# Altium footprint library SWARMUS_LIB.PcbLib: 114 footprints (part 6 of 8)
Each footprint in its own frame and in the unit in brackets; x right, y up, seen from the top. Pads: shape width x height; smd on the part's side, far side on the other; paste and mask are expansions set on the pad; w line width, h text height; cw(c..) or ccw(c..) is an arc to the next point about the centre after c.
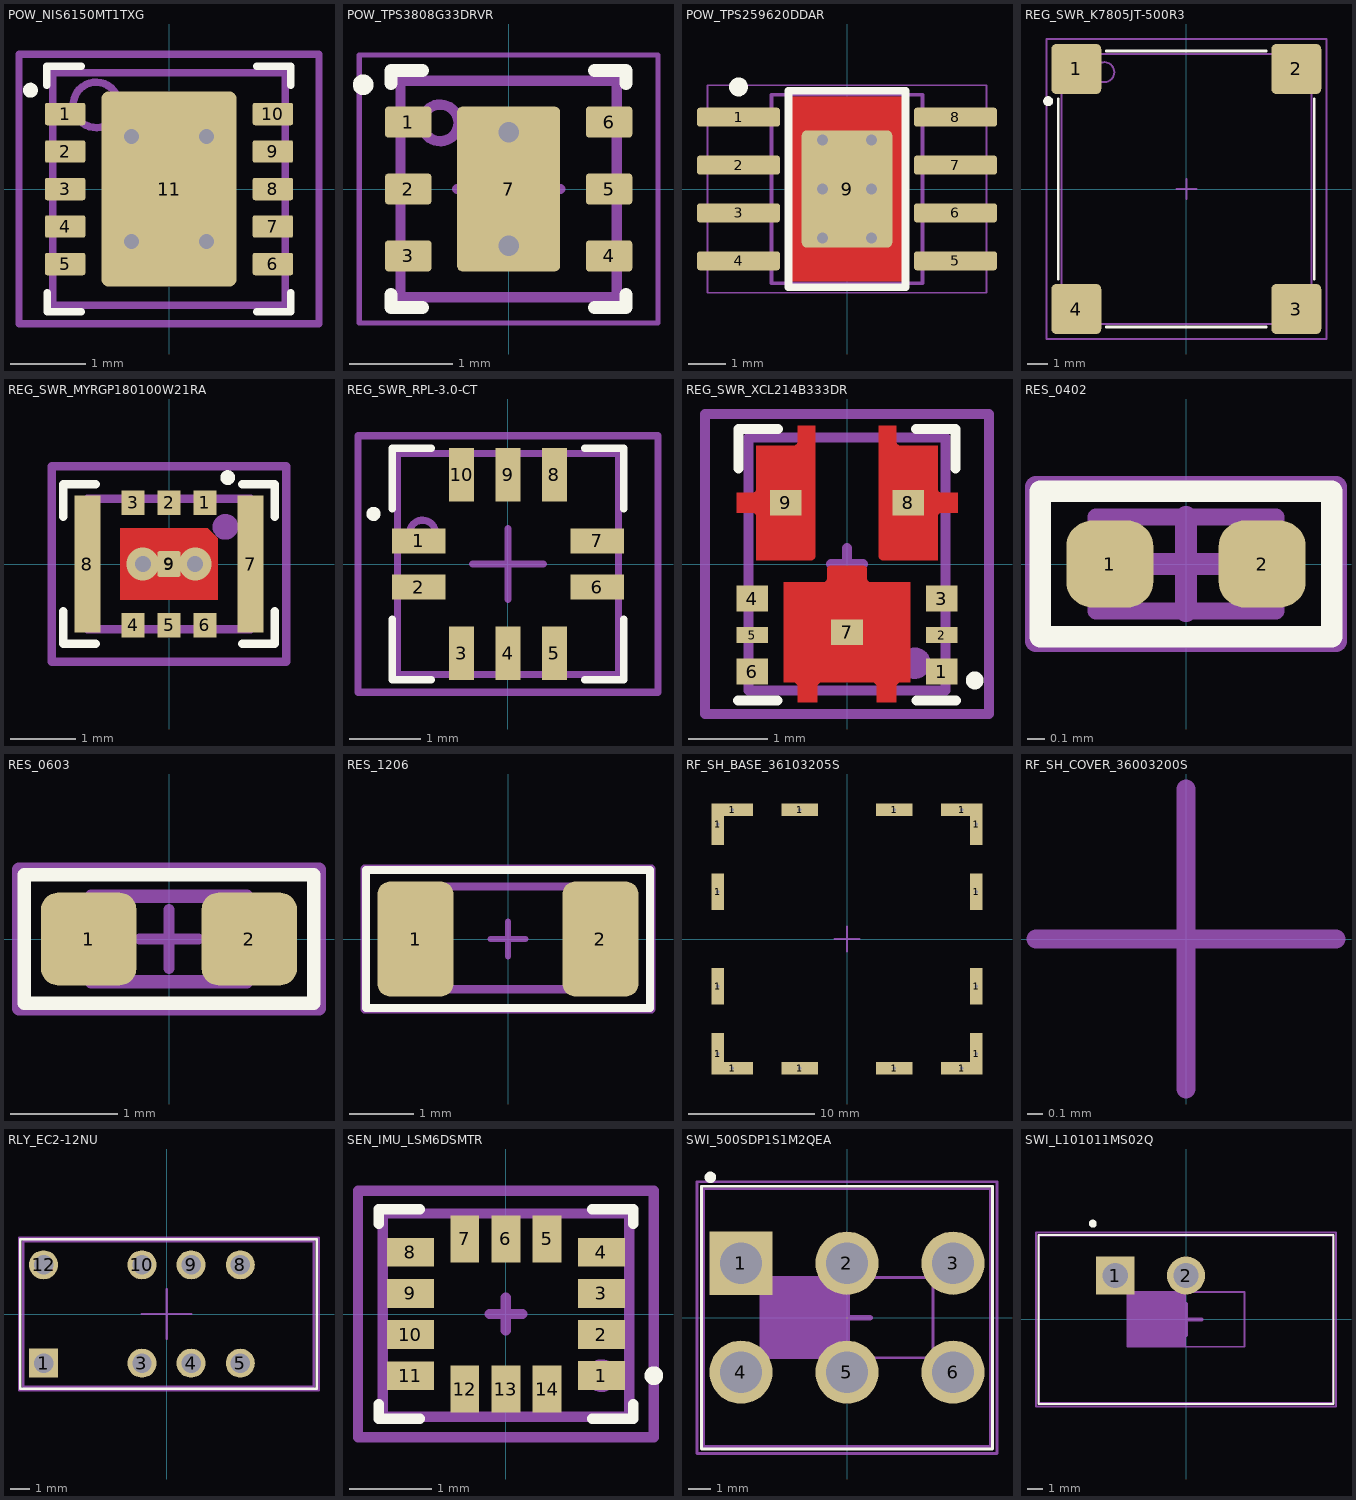
[diagram p5: the footprints below, top view; thin cyan lines are the x and y axes]

## POW_NIS6150MT1TXG [mm] "SON, 10-Leads, Body 3.00x3.00mm, Pitch 0.50mm, Thermal Pad 2.00x1.20mm, IPC Medium Density"
height 0.8
pads (11):
  rrect20% 0.54x0.3 smd paste-0.025 mask+0.048: 1(-1.385,1) 2(-1.385,0.5) 3(-1.385,0) 4(-1.385,-0.5) 5(-1.385,-1) 6(1.385,-1) 7(1.385,-0.5) 8(1.385,0) 9(1.385,0.5) 10(1.385,1)
  rrect10% 1.8x2.6 smd paste-2 mask+0.05: 11(0,0)
via 0.5,-0.7 diameter 0.5 hole 0.2
via 0.5,0.7 diameter 0.5 hole 0.2
via -0.5,-0.7 diameter 0.5 hole 0.2
via -0.5,0.7 diameter 0.5 hole 0.2
Top Overlay:
  circle w0.1: c-1.847,1.317 r0.05
  lines w0.1: -1.627,-1.381 -1.627,-1.64 -1.172,-1.64 ; -1.627,1.381 -1.627,1.639 -1.172,1.639 ; 1.172,1.639 1.627,1.639 1.627,1.381 ; 1.172,-1.64 1.627,-1.64 1.627,-1.381
Top Paste:
  rectangle: -0.8,0.15 0.8,1.25
  region: 0.8,-0.15 -0.8,-0.15 -0.8,-1.25 0.8,-1.25
Top Assembly Drawing:
  circle w0.1: c-0.973,1.122 r0.303
  lines w0.1: -1.55,-1.55 -1.55,1.55 1.55,1.55 1.55,-1.55 -1.55,-1.55
Top Courtyard:
  lines w0.1: -0.5,0 0.5,0 ; 0,-0.5 0,0.5 ; -2,-1.8 -2,1.8 2,1.8 2,-1.8 -2,-1.8
3D body "SON50P300X80_HS-11N.step": height 0.8, standoff 0, extent -1.551,-1.55 1.551,1.55

## POW_TPS3808G33DRVR [mm] "6-WSON"
height 0.8
pads (7):
  rrect20% 0.45x0.3 smd paste+0 mask+0.07: 1(-0.975,0.65) 2(-0.975,0) 3(-0.975,-0.65) 4(0.975,-0.65) 5(0.975,0) 6(0.975,0.65)
  rrect10% 1x1.6 smd paste-1.6 mask+0.07: 7(0,0)
via 0,-0.55 diameter 0.5 hole 0.2
via 0,0.55 diameter 0.5 hole 0.2
Top Overlay:
  circle w0.1: c-1.413,1.012 r0.05
  lines w0.127: -1.141,-1.025 -1.141,-1.15 -0.836,-1.15 ; -1.141,1.025 -1.141,1.15 -0.836,1.15 ; 0.836,-1.15 1.141,-1.15 1.141,-1.025 ; 0.836,1.15 1.141,1.15 1.141,1.025
Top Paste:
  region: 0.5,0.1 0.5,0.749 0.5,0.759 0.492,0.778 0.478,0.792 0.459,0.8 0.449,0.8 -0.449,0.8 -0.459,0.8 -0.478,0.793 -0.492,0.778 -0.499,0.76 -0.499,0.75 -0.499,0.1
  region: -0.5,-0.1 -0.5,-0.749 -0.5,-0.759 -0.492,-0.778 -0.478,-0.792 -0.459,-0.8 -0.449,-0.8 0.449,-0.8 0.459,-0.8 0.478,-0.793 0.492,-0.778 0.499,-0.76 0.499,-0.75 0.499,-0.1
Top Assembly Drawing:
  circle w0.1: c-0.665,0.642 r0.178
  lines w0.1: -1.05,-1.05 1.05,-1.05 1.05,1.05 -1.05,1.05 -1.05,-1.05
Top Courtyard:
  lines w0.05: -1.45,-1.3 1.45,-1.3 1.45,1.3 -1.45,1.3 -1.45,-1.3
  lines w0.1: -0.5,0 0.5,0 ; 0,-0.5 0,0.5
3D body "SON65P200X80_HS-7N.step": height 0.8, standoff 0, extent -1.051,-1.05 1.051,1.05

## POW_TPS259620DDAR [mm] "SOIC, 8-Leads, Body 4.90x3.90mm, Pitch 1.27mm, Thermal Pad 3.10x2.40mm, IPC Medium Density"
height 1.7
pads (9):
  rrect30% 2.2x0.5 smd paste-0.025 mask+0.07: 1(-2.875,1.905) 2(-2.875,0.635) 3(-2.875,-0.635) 4(-2.875,-1.905) 5(2.875,-1.905) 6(2.875,-0.635) 7(2.875,0.635) 8(2.875,1.905)
  rrect10% 2.4x3.1 smd: 9(0,0)
via 0.65,-1.3 diameter 0.5 hole 0.3
via -0.65,-1.3 diameter 0.5 hole 0.3
via 0.65,0 diameter 0.5 hole 0.3
via -0.65,0 diameter 0.5 hole 0.3
via 0.65,1.3 diameter 0.5 hole 0.3
via -0.65,1.3 diameter 0.5 hole 0.3
Top Layer:
  rectangle: -1.475,-2.45 1.475,2.45
Top Overlay:
  circle w0.25: c-2.875,2.705 r0.125
  lines w0.2: -1.55,-2.607 -1.55,2.608 1.55,2.608 1.55,-2.607 -1.55,-2.607
Top Assembly Drawing:
  circle w0.1: c-1.1,1.6 r0.5
  lines w0.1: -2,-2.5 -2,2.5 2,2.5 2,-2.5 -2,-2.5
Top Courtyard:
  lines w0.05: -3.7,-2.75 3.7,-2.75 3.7,2.75 -3.7,2.75 -3.7,-2.75
  lines w0.1: -0.5,0 0.5,0 ; 0,-0.5 0,0.5
3D body "SOIC127P600X170_HS-9N.step": height 1.7, standoff 0, extent -3,-2.5 3,2.5

## REG_SWR_K7805JT-500R3 [mm]
pads (4):
  rrect20% 2.5x2.5 smd paste-0.025 mask+0.07: 1(-5.5,6) 2(5.5,6) 3(5.5,-6) 4(-5.5,-6)
Top Overlay:
  circle w0.25: c-6.904,4.39 r0.125
  lines w0.127: -6.4,-4.5 -6.4,4.5 ; -4,-6.9 4,-6.9 ; -4,6.9 4,6.9 ; 6.4,-4.5 6.4,4.5
Top Assembly Drawing:
  circle w0.1: c-4.099,5.839 r0.5
  lines w0.1: -6.25,-5.75 -6.25,-6.75 ; -6.25,5.75 -6.25,6.75 ; -5.25,-6.75 -6.25,-6.75 ; -5.25,6.75 -6.25,6.75 ; 5.25,-6.75 6.25,-6.75 ; 5.25,6.75 6.25,6.75 ; 6.25,-5.75 6.25,-6.75 ; 6.25,5.75 6.25,6.75 ; -6.25,-6.75 -6.25,6.75 ; -6.25,-6.75 6.25,-6.75 ; -6.25,6.75 6.25,6.75 ; 6.25,-6.75 6.25,6.75
Top Courtyard:
  lines w0.1: -0.5,0 0.5,0 ; 0,-0.5 0,0.5 ; -7,-7.5 7,-7.5 7,7.5 -7,7.5 -7,-7.5
3D body: height 3.3, standoff -3.3, extent -5.5,6 -5.5,6
3D body: height 3.3, standoff -3.3, extent 5.5,6 5.5,6
3D body: height 3.3, standoff -3.3, extent 5.5,-6 5.5,-6
3D body: height 3.3, standoff -3.3, extent -5.5,-6 -5.5,-6
3D body: height 3.5, standoff 0, extent -6.25,-6.75 6.25,6.75

## REG_SWR_MYRGP180100W21RA [mm]
pads (10):
  rect 0.35x0.375 smd paste-1 mask+0.05: 1(0.55,0.937) 2(0,0.937) 3(-0.55,0.937) 4(-0.55,-0.937) 5(0,-0.937) 6(0.55,-0.937) 9(0,0)
  rect 0.4x2.1 smd paste-1 mask+0.05: 7(1.25,0) 8(-1.25,0)
  rect 0.325x0.4 smd paste-1 mask-1: 9(0,0)
via 0.4,0 diameter 0.5 hole 0.25
via -0.4,0 diameter 0.5 hole 0.25
Top Layer:
  region: 0.596,0.55 -0.75,0.55 -0.75,-0.55 0.75,-0.55 0.75,0.396
Top Overlay:
  circle w0.127: c0.9,1.325 r0.05
  lines w0.127: -1.624,-0.723 -1.624,-1.223 -1.124,-1.223 ; -1.624,0.723 -1.624,1.223 -1.124,1.223 ; 1.124,-1.223 1.624,-1.223 1.624,-0.723 ; 1.124,1.223 1.624,1.223 1.624,0.723
Top Paste:
  region: 1.425,1.025 1.1,1.025 1.1,-1.025 1.425,-1.025
  region: -1.425,-1.025 -1.1,-1.025 -1.1,1.025 -1.425,1.025
  region: 0.4,0.8 0.7,0.8 0.7,1.1 0.4,1.1
  region: -0.15,0.8 0.15,0.8 0.15,1.1 -0.15,1.1
  region: -0.4,0.8 -0.7,0.8 -0.7,1.1 -0.4,1.1
  region: -0.4,-0.8 -0.7,-0.8 -0.7,-1.1 -0.4,-1.1
  region: 0.15,-0.8 -0.15,-0.8 -0.15,-1.1 0.15,-1.1
  region: 0.4,-0.8 0.7,-0.8 0.7,-1.1 0.4,-1.1
  region: 0.65,0.45 0.25,0.45 0.25,-0.45 0.65,-0.45
  region: -0.65,-0.45 -0.25,-0.45 -0.25,0.45 -0.65,0.45
Top Assembly Drawing:
  circle w0.254: c0.865,0.57 r0.071
  lines w0.127: -1.25,-1 -1.25,1 1.25,1 1.25,-1 -1.25,-1
Top Courtyard:
  lines w0.127: -0.2,0 0.2,0 ; 0,-0.2 0,0.2 ; -1.8,-1.5 1.8,-1.5 1.8,1.5 -1.8,1.5 -1.8,-1.5
3D body: height 1, standoff 0, extent -1.25,-1 1.25,1

## REG_SWR_RPL-3.0-CT [mm]
pads (10):
  rect 0.75x0.35 smd paste-0.025 mask+0.07: 1(-1.25,0.325) 2(-1.25,-0.325) 6(1.25,-0.325) 7(1.25,0.325)
  rect 0.35x0.75 smd paste-0.025 mask+0.07: 3(-0.65,-1.25) 4(0,-1.25) 5(0.65,-1.25) 8(0.65,1.25) 9(0,1.25) 10(-0.65,1.25)
Top Overlay:
  circle w0.1: c-1.887,0.703 r0.05
  lines w0.1: -1.625,-0.775 -1.625,-1.625 -1.075,-1.625 ; -1.625,0.775 -1.625,1.625 -1.075,1.625 ; 1.075,-1.625 1.625,-1.625 1.625,-0.775 ; 1.075,1.625 1.625,1.625 1.625,0.775
Top Assembly Drawing:
  circle w0.1: c-1.199,0.432 r0.183
  lines w0.1: -1.55,-1.55 -1.55,1.55 1.55,1.55 1.55,-1.55 -1.55,-1.55
Top Courtyard:
  lines w0.1: -0.5,0 0.5,0 ; 0,-0.5 0,0.5 ; -2.105,-1.8 -2.105,1.8 2.105,1.8 2.105,-1.8 -2.105,-1.8
3D body: height 1.5, standoff 0, extent -1.55,-1.55 1.55,1.55

## REG_SWR_XCL214B333DR [mm]
pads (9):
  rect 0.4x0.325 smd paste-0.05 mask+0.05: 1(1.2,-1.363) 3(1.2,-0.438) 4(-1.2,-0.438) 6(-1.2,-1.363)
  rect 0.4x0.2 smd paste-0.05 mask+0.05: 2(1.2,-0.9) 5(-1.2,-0.9)
  rect 0.4x0.325 smd paste-1 mask-1: 7(0,-0.865) 8(0.775,0.775) 9(-0.775,0.775)
Top Layer:
  region: 0.25,-0.07 0.25,-0.06 0.242,-0.042 0.228,-0.028 0.21,-0.02 0.2,-0.02 -0.2,-0.02 -0.21,-0.02 -0.228,-0.028 -0.242,-0.042 -0.25,-0.06 -0.25,-0.07 -0.25,-0.18 -0.251,-0.19 -0.258,-0.208 -0.272,-0.221 -0.29,-0.229 -0.3,-0.23 -0.8,-0.23 -0.8,-1.5 -0.675,-1.5 -0.665,-1.501 -0.647,-1.508 -0.633,-1.522 -0.626,-1.54 -0.625,-1.55 -0.625,-1.75 -0.375,-1.75 -0.375,-1.55 -0.374,-1.54 -0.366,-1.522 -0.353,-1.508 -0.335,-1.501 -0.325,-1.5 0.325,-1.5 0.335,-1.501 0.353,-1.508 0.367,-1.522 0.374,-1.54 0.375,-1.55 0.375,-1.75 0.625,-1.75 0.625,-1.55 0.626,-1.54 0.633,-1.522 0.647,-1.508 0.665,-1.501 0.675,-1.5 0.8,-1.5 0.8,-0.23 0.3,-0.23 0.29,-0.229 0.272,-0.221 0.259,-0.208 0.251,-0.19 0.25,-0.18
  region: -1.15,0.05 -0.45,0.05 -0.44,0.05 -0.421,0.057 -0.407,0.072 -0.4,0.09 -0.4,0.1 -0.4,1.75 -0.625,1.75 -0.625,1.55 -0.626,1.54 -0.633,1.522 -0.647,1.508 -0.665,1.501 -0.675,1.5 -1.15,1.5 -1.15,0.95 -1.151,0.94 -1.158,0.922 -1.172,0.908 -1.19,0.901 -1.2,0.9 -1.4,0.9 -1.4,0.65 -1.2,0.65 -1.19,0.649 -1.172,0.641 -1.158,0.628 -1.151,0.61 -1.15,0.6
  region: 1.15,0.05 0.45,0.05 0.44,0.05 0.421,0.057 0.407,0.072 0.4,0.09 0.4,0.1 0.4,1.75 0.625,1.75 0.625,1.55 0.626,1.54 0.633,1.522 0.647,1.508 0.665,1.501 0.675,1.5 1.15,1.5 1.15,0.95 1.151,0.94 1.158,0.922 1.172,0.908 1.19,0.901 1.2,0.9 1.4,0.9 1.4,0.65 1.2,0.65 1.19,0.649 1.172,0.641 1.158,0.628 1.151,0.61 1.15,0.6
Top Overlay:
  circle w0.127: c1.618,-1.475 r0.05
  lines w0.127: -1.378,-1.727 -0.878,-1.727 ; 0.872,1.712 1.372,1.712 1.372,1.212 ; 0.879,-1.727 1.379,-1.727 ; -1.372,1.712 -1.372,1.212 -1.372,1.712 ; -1.372,1.712 -0.872,1.712 -1.372,1.712
Top Paste:
  region: 1.35,-0.8 1.05,-0.8 1.05,-1 1.35,-1
  rectangle: -1.35,-1 -1.05,-0.8
  region: 0.474,0.675 0.464,0.675 0.446,0.683 0.432,0.697 0.424,0.715 0.424,0.725 0.424,1.7 0.6,1.7 0.6,1.45 0.601,1.441 0.608,1.423 0.622,1.409 0.639,1.401 0.649,1.4 0.65,1.4 1.05,1.4 1.05,0.925 1.051,0.916 1.058,0.898 1.072,0.884 1.089,0.876 1.099,0.875 1.1,0.875 1.35,0.875 1.35,0.675
  region: -0.475,0.675 -0.465,0.675 -0.446,0.683 -0.432,0.697 -0.425,0.715 -0.425,0.725 -0.425,1.7 -0.6,1.7 -0.6,1.45 -0.601,1.441 -0.608,1.423 -0.622,1.409 -0.64,1.401 -0.649,1.4 -0.65,1.4 -1.05,1.4 -1.05,0.925 -1.051,0.916 -1.058,0.898 -1.072,0.884 -1.09,0.876 -1.099,0.875 -1.1,0.875 -1.35,0.875 -1.35,0.675
  region: 0.7,-0.8 -0.7,-0.8 -0.7,-1.4 -0.65,-1.4 -0.641,-1.401 -0.622,-1.409 -0.609,-1.422 -0.601,-1.441 -0.6,-1.45 -0.6,-1.7 -0.4,-1.7 -0.4,-1.45 -0.399,-1.441 -0.392,-1.422 -0.378,-1.409 -0.36,-1.401 -0.35,-1.4 0.35,-1.4 0.359,-1.401 0.377,-1.409 0.391,-1.422 0.399,-1.441 0.4,-1.45 0.4,-1.7 0.6,-1.7 0.6,-1.45 0.601,-1.441 0.608,-1.422 0.622,-1.409 0.64,-1.401 0.65,-1.4 0.7,-1.4
Top Assembly Drawing:
  circle w0.254: c0.861,-1.257 r0.071
  lines w0.127: -1.25,-1.6 1.25,-1.6 1.25,1.6 -1.25,1.6 -1.25,-1.6
Top Courtyard:
  lines w0.127: -0.2,0 0.2,0 ; 0,-0.2 0,0.2 ; -1.8,-1.9 -1.8,1.9 1.8,1.9 1.8,-1.9 -1.8,-1.9
3D body: height 1, standoff 0, extent -1.25,-1.6 1.25,1.6

## RES_0402 [mil] "Resistor - 0402"
height 13.78
pads (2):
  rrect60% 20x20 smd paste+0 mask+1.97: 1(-17.5,0) 2(17.5,0)
Top Overlay:
  lines w5: -33.46,-16.73 -33.46,16.73 33.46,16.73 33.46,-16.73 -33.46,-16.73
Top Assembly Drawing:
  lines w3.94: -20.67,-10.83 -20.67,10.83 20.67,10.83 20.67,-10.83 -20.67,-10.83
Top Courtyard:
  lines w5: -10.83,0 10.83,0 ; 0,-10.83 0,10.83 ; -34.45,-17.72 34.45,-17.72 34.45,17.72 -34.45,17.72 -34.45,-17.72
3D body "User Library-User Library-RES0402-2.STEP": height 12.99, standoff -0.79, extent -19.68,-9.84 19.7,9.85

## RES_0603 [mil] "Resistor - 0603"
height 17.72
pads (2):
  rrect35% 35x34 smd paste+0 mask+1.97: 1(-29.5,0) 2(29.5,0)
Top Overlay:
  lines w5: -53.15,-23.62 53.15,-23.62 53.15,23.62 -53.15,23.62 -53.15,-23.62
Top Assembly Drawing:
  lines w5: -28.54,-15.75 28.54,-15.75 28.54,15.75 -28.54,15.75 -28.54,-15.75
Top Courtyard:
  lines w3.94: -10.83,0 10.83,0 ; 0,-10.83 0,10.83
  lines w5: -55.12,-25.59 55.12,-25.59 55.12,25.59 -55.12,25.59 -55.12,-25.59
3D body "RES0603.stp": height 16.93, standoff -0.79, extent -31.49,-15.74 31.51,15.76

## RES_1206 [mil] "Resistor - 1206"
height 21.65
pads (2):
  rrect34% 47x71 smd paste+0 mask+1.97: 1(-57,0) 2(57,0)
Top Overlay:
  lines w5: -87.52,-42.5 -87.52,42.53 87.51,42.53 87.51,-42.5 -87.52,-42.5
Top Assembly Drawing:
  lines w5: -62.99,-30.99 63.98,-30.99 63.98,32.48 -62.99,32.48 -62.99,-30.99
Top Courtyard:
  lines w3.94: -10.83,0 10.83,0 ; 0,-10.83 0,10.83
  lines w5: -88.58,-43.31 -88.58,43.31 88.58,43.31 88.58,-43.31 -88.58,-43.31
3D body "RES1206.stp": height 20.87, standoff -0.79, extent -61.02,-30.39 61.03,30.71

## RF_SH_BASE_36103205S [mm] "RF shield 20x20x3 base"
height 3
pads (16):
  rect 1x3.3 smd paste-0.1 mask+0.05: 1(-10.25,-9.1) 1(-10.25,9.1) 1(10.25,-9.1) 1(10.25,9.1)
  rect 1x2.9 smd paste-0.1 mask+0.05: 1(-10.25,3.75) 1(-10.25,-3.75) 1(10.25,-3.75) 1(10.25,3.75)
  rect 3.3x1 smd paste-0.1 mask+0.05: 1(-9.1,-10.25) 1(-9.1,10.25) 1(9.1,-10.25) 1(9.1,10.25)
  rect 2.9x1 smd paste-0.1 mask+0.05: 1(-3.75,10.25) 1(-3.75,-10.25) 1(3.75,-10.25) 1(3.75,10.25)
via 10.25,3.75 diameter 0.45 hole 0.25
via 3.75,10.25 diameter 0.45 hole 0.25
via 9.1,10.25 diameter 0.45 hole 0.25
via 10.25,9.1 diameter 0.45 hole 0.25
via -3.75,10.25 diameter 0.45 hole 0.25
via -10.25,3.75 diameter 0.45 hole 0.25
via -10.25,9.1 diameter 0.45 hole 0.25
via -9.1,10.25 diameter 0.45 hole 0.25
via -10.25,-3.75 diameter 0.45 hole 0.25
via -3.75,-10.25 diameter 0.45 hole 0.25
via -9.1,-10.25 diameter 0.45 hole 0.25
via -10.25,-9.1 diameter 0.45 hole 0.25
via 3.75,-10.25 diameter 0.45 hole 0.25
via 10.25,-3.75 diameter 0.45 hole 0.25
via 10.25,-9.1 diameter 0.45 hole 0.25
via 9.1,-10.25 diameter 0.45 hole 0.25
Top Courtyard:
  lines w0.127: -1,0 1,0 ; 0,-1 0,1
3D body "Download_STP_WE-SHC-36103205S (rev1).stp": height 3.2, standoff 0, extent -10.2,-10.2 10.2,10.2

## RF_SH_COVER_36003200S [mm] "RF shield 21x21x3 cover"
height 3.1
Top Courtyard:
  lines w0.127: -1,0 1,0 ; 0,-1 0,1
3D body "Download_STP_WE-SHC-36003200S (rev1).stp": height 3.3, standoff 0.1, extent -10.45,-10.45 10.45,10.45

## RLY_EC2-12NU [mm]
pads (8):
  rect 1.5x1.5 hole 1: 1(-6.35,-2.54)
  round 1.5 hole 1: 3(-1.27,-2.54) 4(1.27,-2.54) 5(3.81,-2.54) 8(3.81,2.54) 9(1.27,2.54) 10(-1.27,2.54) 12(-6.35,2.54)
Top Overlay:
  lines w0.127: -7.55,-3.865 -7.55,3.865 7.75,3.865 7.75,-3.865 -7.55,-3.865
Top Assembly Drawing:
  lines w0.127: -7.4,-3.75 7.6,-3.75 7.6,3.75 -7.4,3.75 -7.4,-3.75
Top Courtyard:
  lines w0.127: 0,1.27 0,-1.27 0,0 -1.27,0 1.27,0 ; -7.62,-3.937 7.874,-3.937 7.874,3.937 -7.62,3.937 -7.62,-3.937
3D body "EC2-5NU--3DModel-STEP-56544.STEP": height 9, standoff -3.6, extent -7.4,-3.75 7.6,3.75

## SEN_IMU_LSM6DSMTR [mm]
pads (14):
  rect 0.575x0.35 smd paste-0.025 mask+0.022: 1(1.162,-0.75) 2(1.162,-0.25) 3(1.162,0.25) 4(1.162,0.75) 8(-1.163,0.75) 9(-1.163,0.25) 10(-1.163,-0.25) 11(-1.163,-0.75)
  rect 0.35x0.575 smd paste-0.025 mask+0.022: 5(0.5,0.913) 6(0,0.913) 7(-0.5,0.913) 12(-0.5,-0.913) 13(0,-0.913) 14(0.5,-0.913)
Top Overlay:
  circle w0.127: c1.8,-0.75 r0.05
  lines w0.127: -1.55,-1.1 -1.55,-1.275 -1.05,-1.275 ; -1.55,1.1 -1.55,1.275 -1.05,1.275 ; 1.05,-1.275 1.55,-1.275 1.55,-1.1 ; 1.05,1.275 1.55,1.275 1.55,1.1
Top Assembly Drawing:
  circle w0.254: c1.162,-0.75 r0.071
  lines w0.127: -1.5,-1.25 -1.5,1.223 1.5,1.223 1.5,-1.25 -1.5,-1.25
Top Courtyard:
  lines w0.127: -0.2,0 0.2,0 ; 0,-0.2 0,0.2 ; -1.8,-1.5 -1.8,1.5 1.8,1.5 1.8,-1.5 -1.8,-1.5
3D body "LSM6DSMTR--3DModel-STEP-56544.STEP": height 0.86, standoff 0, extent -1.5,-1.25 1.5,1.25

## SWI_500SDP1S1M2QEA [mm]
pads (6):
  rect 2.8x2.8 hole 1.85: 1(-4.7,2.415)
  round 2.8 hole 1.85: 2(0,2.415) 3(4.7,2.415) 4(-4.7,-2.415) 5(0,-2.415) 6(4.7,-2.415)
Top Overlay:
  circle w0.254: c-6.059,6.224 r0.127
  lines w0.127: -6.45,-5.825 -6.45,5.825 6.45,5.825 6.45,-5.825 -6.45,-5.825
Top Assembly Drawing:
  circle w0.127: c-5.194,2.463 r0.265
  rectangle: -3.81,-1.778 0,1.778
  lines w0.127: -6.35,-5.715 -6.35,5.715 6.35,5.715 6.35,-5.715 -6.35,-5.715 ; -3.81,-1.778 -3.81,1.778 3.81,1.778 3.81,-1.778 -3.81,-1.778
Top Courtyard:
  lines w0.127: -6.65,-6.025 -6.65,6.025 6.65,6.025 6.65,-6.025 -6.65,-6.025
  lines w0.254: -1.016,0 1.016,0 ; 0,-1.016 0,1.016
3D body "500SDPxS1M2xEA.stp": height 14.2, standoff -5.1, extent -6.35,-5.715 6.35,5.715

## SWI_L101011MS02Q [mm]
pads (2):
  rect 2.48x2.48 hole 1.65: 1(-4.6,2.85)
  round 2.48 hole 1.65: 2(0,2.85)
Top Overlay:
  circle w0.254: c-6.059,6.224 r0.127
  lines w0.127: -9.6,-5.5 9.6,-5.5 9.6,5.5 -9.6,5.5 -9.6,-5.5
Top Assembly Drawing:
  rectangle: -3.81,-1.778 0,1.778
  lines w0.127: -9.563,-5.449 9.563,-5.449 9.563,5.448 -9.563,5.448 -9.563,-5.449 ; -3.81,-1.778 3.81,-1.778 3.81,1.778 -3.81,1.778 -3.81,-1.778
Top Courtyard:
  lines w0.127: -9.75,-5.65 9.75,-5.65 9.75,5.65 -9.75,5.65 -9.75,-5.65
  lines w0.254: -1.016,0 1.016,0 ; 0,-1.016 0,1.016
3D body "L101011MS02Q.step": height 14.19, standoff -4.09, extent -9.563,-5.448 9.563,5.448